# Altium schematic symbol library Electronic Devices_LIB.SchLib: 703 symbols (part 3 of 8) (continued)
## IC_BATT_MANAGEMENT_MCP73831T-2ACI/OT (continued)
footprint IC_BATT_CHARGER_MICROCHIP_SOT95P270X145-5N (SOT-23-5)
pins: 1 STAT, 2 VSS, 3 VBAT, 4 VDD, 5 PROG

## IC_BATT_MANAGEMENT_TP4056
designator U?, comment TP4056
SOP-8-EP Battery Management ICs ROHS; Manufacturer: UMW(Youtai Semiconductor Co., Ltd.); Manufacturer Part Number: TP4056; Supplier: LCSC; ComponentLink1Description: Link Supplier; ComponentLink1URL: https://www.lcsc.com/product-detail/Battery-Management-ICs_UMW-Youtai-Semiconductor-Co-Ltd-TP4056_C725790.html
footprint IC_BATT_MANG_SOP127P600X175-9N (SOP-8-EP)
pins: 1 TEMP, 2 PROG, 3 GND, 4 VCC (power), 5 BAT, 6 ~{STDBY}, 7 ~{CHRG}, 8 CE, 9 EP

## IC_BLE_ARM_BLUENRG-332VC
designator U?, comment BLUENRG-332VC
Wireless SoC Bluetooth 5.3 ARM Cortex-M0+ 64MHz Single Core 192kB Flash 24kB RAM Memory 1.7V to 3.6V 36-Pin WLCSP T/R; Manufacturer: STMicroelectronics; Supplier 1: Digi-Key; Manufacturer Part Number: BLUENRG-332VC; RoHS: Yes; Category: RF Receivers, Transceivers; Stock 1: 250; Pricing 1: 1=4.21, 10=3.158, 25=2.8072, 50=2.6668, 100=2.5967, 500=2.17558, 1000=2.03522, 5000=1.89486 (USD); RoHS Compliant: Yes; Supplier Part Number 1: 497-BLUENRG-332VC-ND
footprint IC_BLE_BLUENRG332VC (36-WLCSP (2.65x 2.59))
pins: A2 VSSSD, A4 VDDA_VCAP, A6 VDD2, B1 VDDSD, B3 VFBSD, B5 RSTN, B7 VSSA, C2 PB12, C4 PB6, C6 PB3, D1 VLXSD, D3 PB13, D5 PB2, D7 PB0, E2 PB14, E4 PB7, E6 PB1, F3 PB15, F5 PB4, F7 PA1, G4 PB5, G6 PA2, H1 VSSSX, H5 PA3, H7 PA0, J4 PA11, J6 PA9, K1 OSCIN, K5 PA10, K7 VSSIO, L2 VDDRF, L4 VSSRFTRX, L6 VSSIFADC, M1 OSCOUT, M5 RF1, M7 PA8

## IC_BRIDGE_UART_CP2102N-A02-GQFN28R
designator U?, comment CP2102N-A02-GQFN28R
Full Speed USB to UART Bridge USB 2.0 3.3V T/R Automotive 28-Pin QFN EP; Manufacturer: Silicon Labs; Operating Supply Current: 9.5mA; Supplier 1: Digikey; Manufacturer Part Number: CP2102N-A02-GQFN28R; RoHS: Yes; Category: USB Interface ICs; Stock 1: 29620; Pricing 1: 1=4.66, 10=4.183, 25=3.954, 100=3.4269, 250=3.2512, 500=2.91728 (USD); Case/Package: QFN; Min Operating Temperature: -40°C; Max Operating Temperature: 85°C; Interface: UART; Series: USBXpress™; Packaging: Cut Tape; ComponentLink1URL: https://www.silabs.com/documents/public/data-sheets/cp2102n-datasheet.pdf?src-supplier=Digikey; ComponentLink1Description: https://www.silabs.com/documents/public/data-sheets/cp2102n-datasheet.pdf?src-supplier=Digikey; ComponentLink2URL: https://4donline.ihs.com/images/VipMasterIC/IC/SILC/SILC-S-A0007770867/SILC-S-A0007770867-1.pdf?hkey=6D3A4C79FDBF58556ACFDE234799DDF0&src-supplier=Farnell; ComponentLink2Description: https://4donline.ihs.com/images/VipMasterIC/IC/SILC/SILC-S-A0007770867/SILC-S-A0007770867-1.pdf?hkey=6D3A4C79FDBF58556ACFDE234799DDF0&src-supplier=Farnell; Supplier Part Number 1: 336-5890-1-ND
footprint IC_BRIDGE_UART_QFN50P500X500X80-29N-D
pins: 1 DCD, 2 RI_/_CLK, 3 GND_1, 4 D+, 5 D-, 6 VDD, 7 VREGIN, 8 VBUS, 9 RSTB, 10 NC, 11 SUSPENDB, 12 SUSPEND, 13 CHREN, 14 CHR1, 15 CHR0, 16 GPIO.3_/_WAKEUP, 17 GPIO.2_/_RS485, 18 GPIO.1_/_RXT, 19 GPIO.0_/_TXT, 20 GPIO.6, 21 GPIO.5, 22 GPIO.4, 23 CTS, 24 RTS, 25 RXD, 26 TXD, 27 DSR, 28 DTR, 29 GND_2

## IC_BUFFER_2CH_SN74LVC2G125DCUT
designator U?, comment SN74LVC2G125DCUT
Buffer/Line Driver 2-CH Non-Inverting 3-ST CMOS 8-Pin VSSOP T/R; Manufacturer: Texas Instruments; Number of Elements: 2; Logic Function: Buffer,Inverting; Max Supply Voltage: 5.5V; Min Supply Voltage: 1.65V; Propagation Delay: 3.7ns; Number of Bits per Element: 1; High Level Output Current: -32mA; Low Level Output Current: 32mA; Turn-On Delay Time: 11.6ns; Quiescent Current: 10uA; Output Type: 3-STATE; Supplier 1: Digi-Key; Manufacturer Part Number: SN74LVC2G125DCUT; RoHS: Yes; Category: Buffers, Drivers and Transceivers; Stock 1: 3865; Pricing 1: 1=1.26, 10=1.126, 25=1.0688, 100=0.8781 (USD); Mount: Surface Mount; Case/Package: VSSOP; Number of Pins: 8; Min Operating Temperature: -40°C; Max Operating Temperature: 125°C; Packaging: Tape and Reel; Package Quantity: 250; Number of Channels: 2; Number of Inputs: 2; Number of Outputs: 2; Number of Input Lines: 2; Number of Output Lines: 2; Polarity: Non-Inverting; Termination: SMD/SMT; Number of Gates: 2; Number of Bits: 2; Series: 74LVC; Technology: CMOS; Radiation Hardening: No; Reach SVHC Compliant: No; Lead Free: Lead Free; RoHS Compliant: Yes; ComponentLink1URL: https://datasheet.ciiva.com/4788/sn74lvc2g125-50903-4788801.pdf?src-supplier=Mouser; ComponentLink1Description: https://datasheet.ciiva.com/4788/sn74lvc2g125-50903-4788801.pdf?src-supplier=Mouser; ComponentLink2URL: https://datasheet.ciiva.com/23785/1633705-23785564.pdf?src-supplier=Newark; ComponentLink2Description: https://datasheet.ciiva.com/23785/1633705-23785564.pdf?src-supplier=Newark; ComponentLink3URL: https://datasheet.ciiva.com/15094/getdatasheetpartid-40911-15094151.pdf?src-supplier=Verical; ComponentLink3Description: https://datasheet.ciiva.com/15094/getdatasheetpartid-40911-15094151.pdf?src-supplier=Verical; ComponentLink4URL: https://datasheet.ciiva.com/41455/001017176-da-01-en-ic-bus-buf-sn74lvc2g125dcut-vssop-8-tid-41455955.pdf?src-supplier=Conrad; ComponentLink4Description: https://datasheet.ciiva.com/41455/001017176-da-01-en-ic-bus-buf-sn74lvc2g125dcut-vssop-8-tid-41455955.pdf?src-supplier=Conrad; ComponentLink5URL: https://datasheet.ciiva.com/7744/1781747-7744025.pdf?src-supplier=Element14; ComponentLink5Description: https://datasheet.ciiva.com/7744/1781747-7744025.pdf?src-supplier=Element14; ComponentLink6URL: https://datasheet.ciiva.com/1841/sn74lvc2g125-1841967.pdf?src-supplier=Digi-Key; ComponentLink6Description: https://datasheet.ciiva.com/1841/sn74lvc2g125-1841967.pdf?src-supplier=Digi-Key; ComponentLink7URL: https://datasheet.ciiva.com/1841/sn74lvc2g125-1841966.pdf?src-supplier=Digi-Key; ComponentLink7Description: https://datasheet.ciiva.com/1841/sn74lvc2g125-1841966.pdf?src-supplier=Digi-Key; ComponentLink8URL: https://datasheet.ciiva.com/1841/sn74lvc2g125-1841968.pdf?src-supplier=Digi-Key; ComponentLink8Description: https://datasheet.ciiva.com/1841/sn74lvc2g125-1841968.pdf?src-supplier=Digi-Key; Supplier Part Number 1: 296-26616-1-ND
footprint IC_BUFF_SOP50P310X90-8N (8-VFSOP (0.091", 2.30mm Width))
pins: 1 ~{1OE}, 2 1A, 3 2Y, 4 GND, 5 2A, 6 1Y, 7 ~{2OE}, 8 VCC

## IC_BUFFER_NC7NZ34K8X
designator U?, comment NC7NZ34K8X
TINYLOGIC UHS TRIPLE BUFFER Buffer, LVC/LCX/Z Series, 3-Func, 1-Input, CMOS, PDSO8; Manufacturer: ON Semiconductor / Fairchild; Min Supply Voltage: 1.65V; Max Supply Voltage: 5.5V; Propagation Delay: 8.8ns; Max Power Dissipation: 250mW; High Level Output Current: -32mA; Low Level Output Current: 32mA; Number of Input Lines: 3; Number of Output Lines: 1; Polarity: Non-Inverting; Operating Supply Voltage: 1.8V; Logic Function: Buffer,Inverting; Turn-On Delay Time: 4.6ns; Quiescent Current: 1uA; Schmitt Trigger Input: No; Supplier 1: Mouser; Manufacturer Part Number: NC7NZ34K8X; RoHS: Yes; Category: Amplifiers - Op Amps, Buffer, Instrumentation; Stock 1: 2018; Pricing 1: 1=0.51, 10=0.418, 50=0.418, 100=0.272, 1000=0.169, 3000=0.128, 9000=0.119, 10000=0.119, 24000=0.113, 45000=0.111, 99000=0.11 (USD); Mount: Surface Mount; Number of Pins: 8; Weight: 0.03g; Min Operating Temperature: -40°C; Max Operating Temperature: 85°C; Packaging: Tape and Reel; Number of Channels: 3; Number of Inputs: 3; Number of Outputs: 3; Package Quantity: 1; Number of Elements: 3; Number of Bits per Element: 1; Number of Bits: 3; Series: 7NZ; Technology: CMOS; Number of Functions: 3; Supply Voltage-Nom: 5.5V; Length: 2mm; Width: 2.3mm; Height: 0.7mm; Radiation Hardening: No; RoHS Compliant: Yes; Reach SVHC Compliant: No; Lead Free: Lead Free; ComponentLink1URL: https://datasheet.ciiva.com/1619/1727675-1619888.pdf?src-supplier=Newark; ComponentLink1Description: https://datasheet.ciiva.com/1619/1727675-1619888.pdf?src-supplier=Newark; ComponentLink2URL: https://datasheet.ciiva.com/27051/1011220-27051212.pdf?src-supplier=Jameco; ComponentLink2Description: https://datasheet.ciiva.com/27051/1011220-27051212.pdf?src-supplier=Jameco; ComponentLink3URL: https://datasheet.ciiva.com/1832/nc7nz34-1832298.pdf?src-supplier=Digikey; ComponentLink3Description: https://datasheet.ciiva.com/1832/nc7nz34-1832298.pdf?src-supplier=Digikey; ComponentLink4URL: https://datasheet.ciiva.com/1832/nc7nz34-1832297.pdf?src-supplier=Digikey; ComponentLink4Description: https://datasheet.ciiva.com/1832/nc7nz34-1832297.pdf?src-supplier=Digikey; ComponentLink5URL: https://datasheet.ciiva.com/1832/nc7nz34-1832299.pdf?src-supplier=Digikey; ComponentLink5Description: https://datasheet.ciiva.com/1832/nc7nz34-1832299.pdf?src-supplier=Digikey; Supplier Part Number 1: 512-NC7NZ34K8X
footprint IC_BUFFER_SOP50P310X90-8N
pins: 1 1A, 2 3Y, 3 2A, 4 GND, 5 2Y, 6 3A, 7 1Y, 8 VCC

## IC_BUFFER_SN74LVC1G125DRYR
designator U?, comment SN74LVC1G125DRYR
Buffer/Line Driver 1-CH Non-Inverting 3-ST CMOS Medical 6-Pin USON T/R; Manufacturer: Texas Instruments; Propagation Delay: 4.5ns; Number of Gates: 1; Logic Function: Buffer,Inverting; Max Supply Voltage: 5.5V; Min Supply Voltage: 1.65V; High Level Output Current: -32mA; Low Level Output Current: 32mA; Turn-On Delay Time: 10.1ns; Quiescent Current: 10uA; Output Type: 3-STATE; Supplier 1: Mouser; Manufacturer Part Number: SN74LVC1G125DRYR; RoHS: Yes; Category: Buffers, Drivers and Transceivers; Stock 1: 12218; Pricing 1: 1=0.25, 10=0.154, 50=0.17, 100=0.121, 500=0.115, 1000=0.104, 5000=0.091, 10000=0.085, 25000=0.082, 50000=0.078 (USD); Mount: Surface Mount; Case/Package: SON; Number of Pins: 6; Min Operating Temperature: -40°C; Max Operating Temperature: 125°C; Packaging: Tape and Reel; Number of Bits: 1; Package Quantity: 1; Number of Elements: 1; Number of Channels: 1; Number of Inputs: 1; Number of Outputs: 1; Number of Bits per Element: 1; Number of Input Lines: 1; Number of Output Lines: 1; Polarity: Non-Inverting; Series: 74LVC; Technology: CMOS; Radiation Hardening: No; Lead Free: Lead Free; RoHS Compliant: Yes; Reach SVHC Compliant: Unknown; ComponentLink1URL: https://datasheet.ciiva.com/15095/getdatasheetpartid-194373-15095016.pdf?src-supplier=Verical; ComponentLink1Description: https://datasheet.ciiva.com/15095/getdatasheetpartid-194373-15095016.pdf?src-supplier=Verical; ComponentLink2URL: https://datasheet.ciiva.com/1835/sn74lvc1g125-1835038.pdf?src-supplier=Digikey; ComponentLink2Description: https://datasheet.ciiva.com/1835/sn74lvc1g125-1835038.pdf?src-supplier=Digikey; ComponentLink3URL: https://datasheet.ciiva.com/1835/sn74lvc1g125-1835039.pdf?src-supplier=Digikey; ComponentLink3Description: https://datasheet.ciiva.com/1835/sn74lvc1g125-1835039.pdf?src-supplier=Digikey; ComponentLink4URL: https://datasheet.ciiva.com/1835/sn74lvc1g125-1835040.pdf?src-supplier=Digikey; ComponentLink4Description: https://datasheet.ciiva.com/1835/sn74lvc1g125-1835040.pdf?src-supplier=Digikey; Supplier Part Number 1: 595-SN74LVC1G125DRYR
footprint IC_BUFFER_SN74LVC1G125DRYR
pins: 1 ~{OE}, 2 A, 3 GND, 4 Y, 5 N.C., 6 VCC

## IC_CLOCK_GENERATOR_CS2100CP-CZZ
designator U?, comment CS2100CP-CZZ
Clock Multiplier 10-Pin MSOP Rail; Manufacturer: Cirrus Logic; Number of Circuits: 1; Max Frequency: 75MHz; PLL: Yes; Number of Outputs: 2; Min Supply Voltage: 3.1V; Max Supply Voltage: 3.5V; Input Current: 10mA; Supplier 1: Mouser; Manufacturer Part Number: CS2100CP-CZZ; RoHS: Yes; Category: Clock Generators, PLLs, Frequency Synthesizers; Stock 1: 6385; Pricing 1: 1=8.47, 10=7.66, 25=7.3, 50=7.3, 96=6.34, 100=6.34, 288=6.06, 576=5.52, 1000=5.52, 1056=4.81, 10000=4.81 (USD); Mount: Surface Mount; Case/Package: MSOP; Number of Pins: 10; Min Operating Temperature: -10°C; Max Operating Temperature: 70°C; Packaging: Rail/Tube; Package Quantity: 96; Input: Clock; Series: -; Frequency: 75MHz; RoHS Compliant: Yes; ComponentLink1URL: https://datasheet.ciiva.com/6687/cs2100-cp-f2-6687623.pdf?src-supplier=Digikey; ComponentLink1Description: https://datasheet.ciiva.com/6687/cs2100-cp-f2-6687623.pdf?src-supplier=Digikey; ComponentLink2URL: https://datasheet.ciiva.com/1138/51788-1138951.pdf?src-supplier=Element14; ComponentLink2Description: https://datasheet.ciiva.com/1138/51788-1138951.pdf?src-supplier=Element14; ComponentLink3URL: https://datasheet.ciiva.com/4771/cs2000-cp-f2-27105-4771797.pdf?src-supplier=Mouser; ComponentLink3Description: https://datasheet.ciiva.com/4771/cs2000-cp-f2-27105-4771797.pdf?src-supplier=Mouser; Supplier Part Number 1: 777-CS2100CP-CZZ
footprint IC_CLOCK_CIR-MSOP-10
pins: 1 VD, 2 GND, 3 CLK_OUT, 4 AUX_OUT, 5 CLK_IN, 6 XTO, 7 XTI/REF_CLK, 8 AD0/*CS, 9 SCL/CCLK, 10 SDA/CDIN

## IC_CLOCK_GENERATOR_SI5351A-B-GT
designator U?, comment SI5351A-B-GT
Clock Generator 25MHz to 27MHz-IN 200MHz-OUT 10-Pin MSOP Bulk; Manufacturer: Skyworks Solutions; Supplier 1: Mouser; Manufacturer Part Number: SI5351A-B-GT; RoHS: No; Category: Clock Generators, PLLs, Frequency Synthesizers; Stock 1: 12760; Pricing 1: 1=3.32, 10=2.13, 50=2.13, 95=1.54, 100=1.6, 285=1.46, 570=1.34, 1000=1.39, 1045=1.17, 2565=1.09, 5035=1.05, 10000=1.05 (USD); Supplier Part Number 1: 634-SI5351A-B-GT
footprint IC_CLOCK_SOP50P490X110-10N
pins: 1 VDD, 2 XA, 3 XB, 4 SCL, 5 SDA, 6 CLK2, 7 VDDO, 8 GND, 9 CLK1, 10 CLK0

## IC_CMOS_SENSOR_0S08C10
designator U?, comment 0S08C10
footprint IC_CMOS_OS08C10
pins: A1 AVDD, A2 AGND, A3 MDP3, A4 MDP1, A5 MCN, A5 MDN1, A6 MDN0, A7 MDN2, A8 DVDD, B1 DVDD, B2 DOGND, B3 MDN3, B5 MCP, B6 MDP0, B7 MDP2, B8 FSIN, B9 DOVDD, C1 VN2, C2 ATEST, C3 EVDD, C4 EGND, C5 AVDD, C6 EGND, C7 AGND, C8 DVDD, C9 SDA, D1 VH2, D2 VN1, D3 DVDD, D4 EGND, D5 DVDD, D7 VSYNC, D8 SID, D9 SCL, E1 VH1, E2 DVDD, E4 DOGND, E5 AVDD, E6 STROBE, E7 PWDNB, E8 TM, E9 XSHUTDOWN, F1 DOGND, F2 DOGND, F4 XVCLK, F5 DOGND, F6 DOGND, F7 DOGND, F8 AVDD, F9 DVDD, G1 AGND, G2 AVDD, G5 AGND, G6 DOVDD, G7 GPIO0, G8 GPIO1, G9 EVDD, G9 AGND

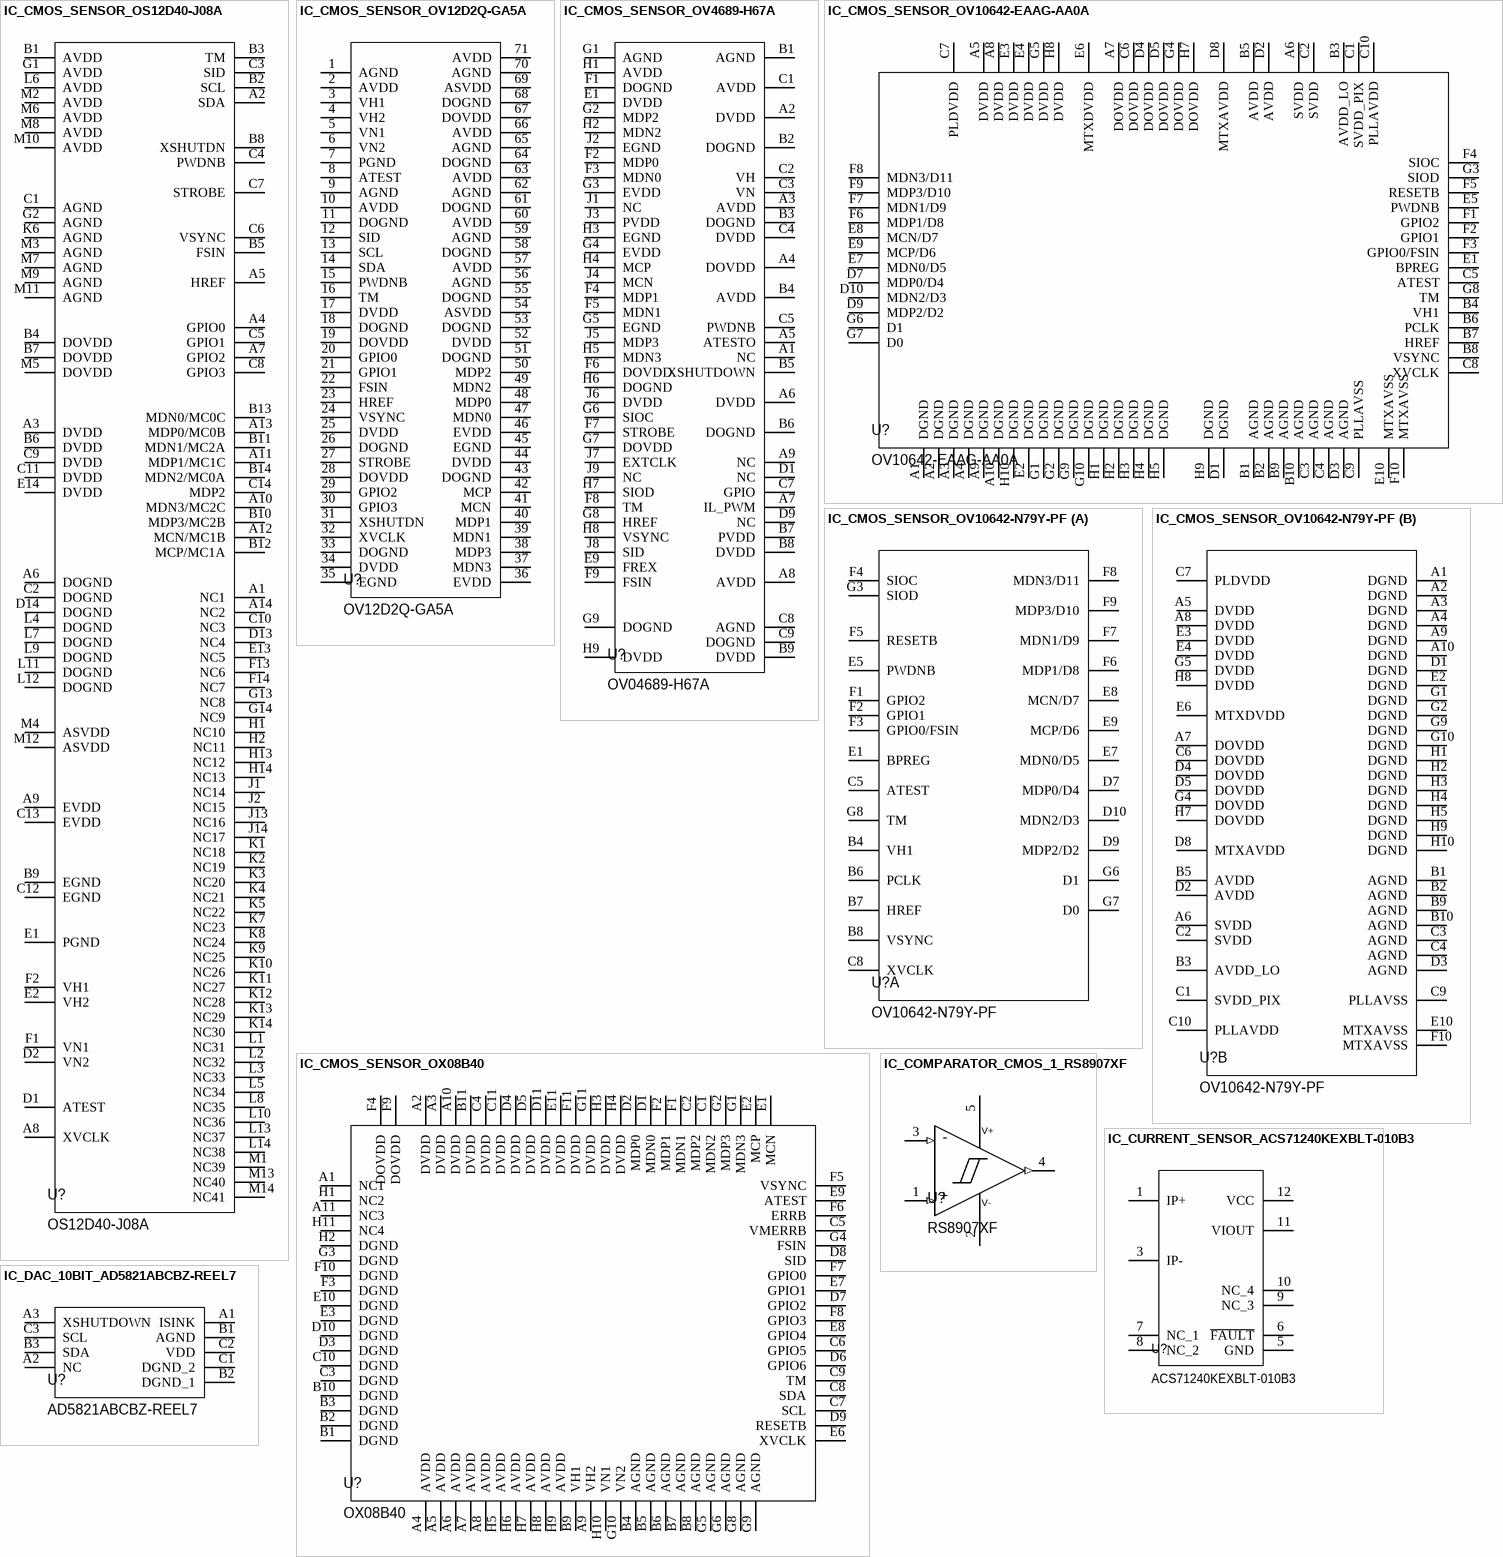
[diagram p8: symbols IC_CMOS_SENSOR_OS12D40-J08A to IC_DAC_10BIT_AD5821ABCBZ-REEL7]

## IC_CMOS_SENSOR_OS12D40-J08A
designator U?, comment OS12D40-J08A
Image Sensor Color CMOS 4512x2512Pixels 108-Pin Die; Manufacturer: OmniVision Technologies; Supplier 1: Digikey; Manufacturer Part Number: OS12D40-J08A; RoHS: No; Supplier Part Number 1: 884-OS12D40-J08A-ND
footprint IC_CMOS_OS12D40 (108-PIN-FANOUT BGA)
pins: A1 NC1, A2 SDA, A3 DVDD, A4 GPIO0, A5 HREF, A6 DOGND, A7 GPIO2, A8 XVCLK, A9 EVDD, A10 MDN3/MC2C, A11 MDP1/MC1C, A12 MCN/MC1B, A13 MDP0/MC0B, A14 NC2, B1 AVDD, B2 SCL, B3 TM, B4 DOVDD, B5 FSIN, B6 DVDD, B7 DOVDD, B8 XSHUTDN, B9 EGND, B10 MDP3/MC2B, B11 MDN1/MC2A, B12 MCP/MC1A, B13 MDN0/MC0C, B14 MDN2/MC0A, C1 AGND, C2 DOGND, C3 SID, C4 PWDNB, C5 GPIO1, C6 VSYNC, C7 STROBE, C8 GPIO3, C9 DVDD, C10 NC3, C11 DVDD, C12 EGND, C13 EVDD, C14 MDP2, D1 ATEST, D2 VN2, D13 NC4, D14 DOGND, E1 PGND, E2 VH2, E13 NC5, E14 DVDD, F1 VN1, F2 VH1, F13 NC6, F14 NC7, G1 AVDD, G2 AGND, G13 NC8, G14 NC9, H1 NC10, H2 NC11, H13 NC12, H14 NC13, J1 NC14, J2 NC15, J13 NC16, J14 NC17, K1 NC18, K2 NC19, K3 NC20, K4 NC21, K5 NC22, K6 AGND, K7 NC23, K8 NC24, K9 NC25, K10 NC26, K11 NC27, K12 NC28, K13 NC29, K14 NC30, L1 NC31, L2 NC32, L3 NC33, L4 DOGND, L5 NC34, L6 AVDD, L7 DOGND, L8 NC35, L9 DOGND, L10 NC36, L11 DOGND, L12 DOGND, L13 NC37, L14 NC38, M1 NC39, M2 AVDD, M3 AGND, M4 ASVDD, M5 DOVDD, M6 AVDD, M7 AGND, M8 AVDD, M9 AGND, M10 AVDD, M11 AGND, M12 ASVDD, M13 NC40, M14 NC41

## IC_CMOS_SENSOR_OV12D2Q-GA5A
designator U?, comment OV12D2Q-GA5A
CMOS SENSOR OV12D2Q-GA5A; Manufacturer: Omnivision Technologies; Supplier 1: DigiKey; Manufacturer Part Number: OV12D2Q-GA5A; Supplier Part Number 1: 884-OV12D2Q-GA5A-ND
footprint IC CMOS SENSOR OV 12D2Q
pins: 1 AGND, 2 AVDD, 3 VH1, 4 VH2, 5 VN1, 6 VN2, 7 PGND, 8 ATEST, 9 AGND, 10 AVDD, 11 DOGND, 12 SID, 13 SCL, 14 SDA, 15 PWDNB, 16 TM, 17 DVDD, 18 DOGND, 19 DOVDD, 20 GPIO0, 21 GPIO1, 22 FSIN, 23 HREF, 24 VSYNC, 25 DVDD, 26 DOGND, 27 STROBE, 28 DOVDD, 29 GPIO2, 30 GPIO3, 31 XSHUTDN, 32 XVCLK, 33 DOGND, 34 DVDD, 35 EGND, 36 EVDD, 37 MDN3, 38 MDP3, 39 MDN1, 40 MDP1, 41 MCN, 42 MCP, 43 DOGND, 44 DVDD, 45 EGND, 46 EVDD, 47 MDN0, 48 MDP0, 49 MDN2, 50 MDP2, 51 DOGND, 52 DVDD, 53 DOGND, 54 ASVDD, 55 DOGND, 56 AGND, 57 AVDD, 58 DOGND, 59 AGND, 60 AVDD, 61 DOGND, 62 AGND, 63 AVDD, 64 DOGND, 65 AGND, 66 AVDD, 67 DOVDD, 68 DOGND, 69 ASVDD, 70 AGND, 71 AVDD

## IC_CMOS_SENSOR_OV4689-H67A
designator U?, comment OV04689-H67A
Image Sensor Color CMOS 2688 x 1520Pixels 67-Pin CSP-5; Manufacturer: OmniVision Technologies; Supplier 1: Digikey; Manufacturer Part Number: OV04689-H67A; RoHS: Yes; Series: -; RoHS Compliant: Yes; Supplier Part Number 1: OV04689-H67A-ND
footprint CMOS_OV04689-H67A_BGA81C58P9X9_662X582X83 (BGA, 67-Leads, Body 6.63x5.82mmx0.83mm, Pitch 0.58mm)
pins: A1 NC, A2 DVDD, A3 AVDD, A4 DOVDD, A5 ATESTO, A6 DVDD, A7 IL_PWM, A8 AVDD, A9 NC, B1 AGND, B2 DOGND, B3 DOGND, B4 AVDD, B5 XSHUTDOWN, B6 DOGND, B7 PVDD, B8 DVDD, B9 DVDD, C1 AVDD, C2 VH, C3 VN, C4 DVDD, C5 PWDNB, C7 GPIO, C8 AGND, C9 DOGND, D1 NC, D9 NC, E1 DVDD, E9 FREX, F1 DOGND, F2 MDP0, F3 MDN0, F4 MDP1, F5 MDN1, F6 DOVDD, F7 STROBE, F8 TM, F9 FSIN, G1 AGND, G2 MDP2, G3 EVDD, G4 EVDD, G5 EGND, G6 SIOC, G7 DOVDD, G8 HREF, G9 DOGND, H1 AVDD, H2 MDN2, H3 EGND, H4 MCP, H5 MDN3, H6 DOGND, H7 SIOD, H8 VSYNC, H9 DVDD, J1 NC, J2 EGND, J3 PVDD, J4 MCN, J5 MDP3, J6 DVDD, J7 EXTCLK, J8 SID, J9 NC

## IC_CMOS_SENSOR_OV10642-EAAG-AA0A
designator U?, comment OV10642-EAAG-AA0A
1/2.56" RCCC 1.3‑Megapixel (1280 x 1080) High Dynamic Range (HDR) High Definition (HD) CMOS Image Sensor with OmniBSI™ Technology; Manufacturer: OmniVision Technologies; Supplier 1: Arrow Electronics; Manufacturer Part Number: OV10642-EAAG-AA0A; RoHS: No; Pricing 1: 1=90 (USD); Supplier Part Number 1: OV10642-EAAG-AA0A
footprint IC_CMOS_OV10642
pins: A1 DGND, A2 DGND, A3 DGND, A4 DGND, A5 DVDD, A6 SVDD, A7 DOVDD, A8 DVDD, A9 DGND, A10 DGND, B1 AGND, B2 AGND, B3 AVDD_LO, B4 VH1, B5 AVDD, B6 PCLK, B7 HREF, B8 VSYNC, B9 AGND, B10 AGND, C1 SVDD_PIX, C2 SVDD, C3 AGND, C4 AGND, C5 ATEST, C6 DOVDD, C7 PLDVDD, C8 XVCLK, C9 PLLAVSS, C10 PLLAVDD, D1 DGND, D2 AVDD, D3 AGND, D4 DOVDD, D5 DOVDD, D7 MDP0/D4, D8 MTXAVDD, D9 MDP2/D2, D10 MDN2/D3, E1 BPREG, E2 DGND, E3 DVDD, E4 DVDD, E5 PWDNB, E6 MTXDVDD, E7 MDN0/D5, E8 MCN/D7, E9 MCP/D6, E10 MTXAVSS, F1 GPIO2, F2 GPIO1, F3 GPIO0/FSIN, F4 SIOC, F5 RESETB, F6 MDP1/D8, F7 MDN1/D9, F8 MDN3/D11, F9 MDP3/D10, F10 MTXAVSS, G1 DGND, G2 DGND, G3 SIOD, G4 DOVDD, G5 DVDD, G6 D1, G7 D0, G8 TM, G9 DGND, G10 DGND, H1 DGND, H2 DGND, H3 DGND, H4 DGND, H5 DGND, H7 DOVDD, H8 DVDD, H9 DGND, H10 DGND

## IC_CMOS_SENSOR_OV10642-N79Y-PF
designator U?, comment OV10642-N79Y-PF
Manufacturer: OmniVision Technologies; Supplier 1: Digikey; Manufacturer Part Number: OV10642-N79Y-PF; RoHS: No; Pricing 1: 1=22.69, 10=16.641, 25=15.0892, 100=13.3574, 250=12.51984, 500=12.425 (USD); Supplier Part Number 1: 884-OV10642-N79Y-PF-ND
footprint IC_CMOS_OV10642
part A pins: B4 VH1, B6 PCLK, B7 HREF, B8 VSYNC, C5 ATEST, C8 XVCLK, D7 MDP0/D4, D9 MDP2/D2, D10 MDN2/D3, E1 BPREG, E5 PWDNB, E7 MDN0/D5, E8 MCN/D7, E9 MCP/D6, F1 GPIO2, F2 GPIO1, F3 GPIO0/FSIN, F4 SIOC, F5 RESETB, F6 MDP1/D8, F7 MDN1/D9, F8 MDN3/D11, F9 MDP3/D10, G3 SIOD, G6 D1, G7 D0, G8 TM
part B pins: A1 DGND, A2 DGND, A3 DGND, A4 DGND, A5 DVDD, A6 SVDD, A7 DOVDD, A8 DVDD, A9 DGND, A10 DGND, B1 AGND, B2 AGND, B3 AVDD_LO, B5 AVDD, B9 AGND, B10 AGND, C1 SVDD_PIX, C2 SVDD, C3 AGND, C4 AGND, C6 DOVDD, C7 PLDVDD, C9 PLLAVSS, C10 PLLAVDD, D1 DGND, D2 AVDD, D3 AGND, D4 DOVDD, D5 DOVDD, D8 MTXAVDD, E2 DGND, E3 DVDD, E4 DVDD, E6 MTXDVDD, E10 MTXAVSS, F10 MTXAVSS, G1 DGND, G2 DGND, G4 DOVDD, G5 DVDD, G9 DGND, G10 DGND, H1 DGND, H2 DGND, H3 DGND, H4 DGND, H5 DGND, H7 DOVDD, H8 DVDD, H9 DGND, H10 DGND